# Altium footprint library THU VIEN V1.PcbLib: 400 footprints (part 21 of 25)
Each footprint in its own frame and in the unit in brackets; x right, y up, seen from the top. Pads: shape width x height; smd on the part's side, far side on the other; paste and mask are expansions set on the pad; w line width, h text height; cw(c..) or ccw(c..) is an arc to the next point about the centre after c.
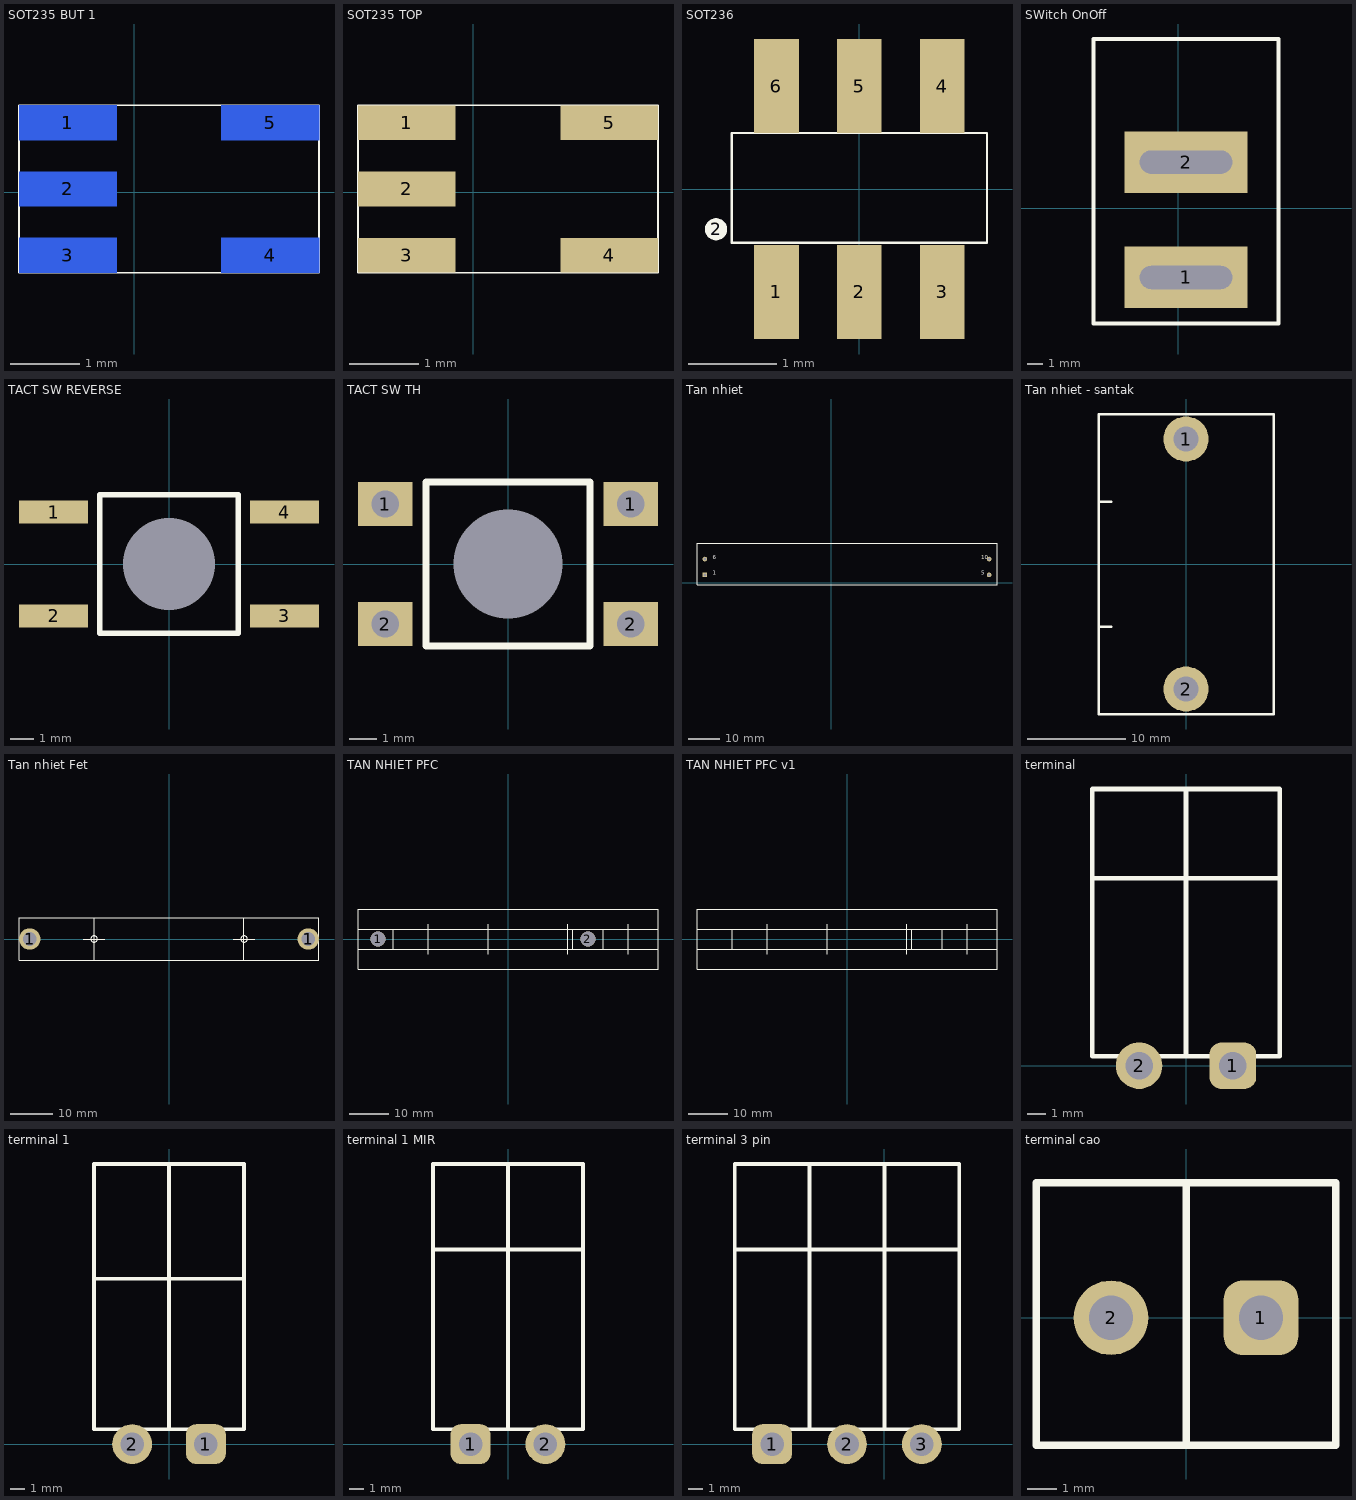
[diagram p20: the footprints below, top view; thin cyan lines are the x and y axes]

## SOT235 BUT 1 [mm]
pads (5):
  rect 1.4x0.5 smd far side: 1(-0.95,1) 2(-0.95,0.05) 3(-0.95,-0.9) 4(1.95,-0.9) 5(1.95,1)
Top Overlay:
  lines w0.025: -1.65,-1.15 -1.65,1.25 2.65,1.25 2.65,-1.15 -1.65,-1.15
3D body: height -0.38, standoff -1.68, extent -1,-1.45 2,1.55

## SOT235 TOP [mm]
pads (5):
  rect 1.4x0.5 smd: 1(-0.95,1) 2(-0.95,0.05) 3(-0.95,-0.9) 4(1.95,-0.9) 5(1.95,1)
Top Overlay:
  lines w0.025: -1.65,-1.15 2.65,-1.15 2.65,1.25 -1.65,1.25 -1.65,-1.15
3D body: height 1.3, standoff 0, extent -1,-1.45 2,1.55

## SOT236 [mil]
pads (7):
  rect 20x42 smd: 1(-37,-46) 2(0,-46) 3(37,-46) 4(37,46) 5(0,46) 6(-37,46)
  round 10 on Top Overlay: 2(-64,-18)
Top Overlay:
  lines w1: -57,-24 -57,25 57,25 57,-24 -57,-24
3D body: height 39.37, standoff 0, extent -57.48,-46.06 57.48,46.07

## SWitch OnOff [mm] "Cong tac dong ngat"
pads (2):
  rect 8x4 hole 1.5 slot 6 at 0 deg: 1(0.5,-4.5) 2(0.5,3)
Top Overlay:
  lines w0.254: -5.5,-7.5 -5.5,11 6.5,11 6.5,-7.5 -5.5,-7.5

## TACT SW REVERSE [mm]
pads (5):
  rect 3x1 smd: 1(-5,2.25) 2(-5,-2.25) 3(5,-2.25) 4(5,2.25)
  round 0 hole 4: ""(0,0)
Top Overlay:
  lines w0.254: -3,-3 3,-3 3,3 -3,3 -3,-3

## TACT SW TH [mm]
pads (5):
  rect 2x1.6 hole 1: 1(-4.5,2.2) 1(4.5,2.2) 2(-4.5,-2.2) 2(4.5,-2.2)
  round 0 hole 4: ""(0,0)
Top Overlay:
  lines w0.254: -3,-3 -3,3 3,3 3,-3 -3,-3

## Tan nhiet [mm] "Connector; Header; 5x2 Position"
pads (4):
  rect 1.5x1.5 hole 0.9: 1(-40.64,2.54)
  round 1.5 hole 0.9: 5(50.8,2.54) 6(-40.64,7.62) 10(50.8,7.62)
Top Overlay:
  lines w0.2: -43.18,-0.635 -43.18,12.7 53.34,12.7 53.34,-0.635 -43.18,-0.635
  text "6" at -38.1,7.62 h1.27
  text "10" at 48.26,7.62 h1.27
  text "5" at 48.26,2.54 h1.27
  text "1" at -38.1,2.54 h1.27
3D body: height 103.52, standoff 0.52, extent -44.92,-0.979 55.08,33.02

## Tan nhiet - santak [mil]
pads (2):
  round 180 hole 100: 1(0,500) 2(0,-500)
Top Overlay:
  lines w10: -350,-250 -300,-250 ; -350,250 -300,250 ; -350,-600 350,-600 350,600 -350,600 -350,-600
Mechanical 1:
  circle w5: c0,500 r45
3D body: height 300, standoff -200, extent -50,-549.9 49.61,-450.1
3D body: height 300, standoff -200, extent -50,450.1 49.61,549.9
3D body: height 1400, standoff 10, extent -350,-600 350,602

## Tan nhiet Fet [mil]
pads (2):
  round 200 hole 130: 1(-1300,0) 1(1300,0)
Top Overlay:
  circle w10: c700,0 r30
  circle w10: c-700,0 r30
  lines w10: -800,0 -600,0 ; -700,-200 -700,200 ; 600,0 800,0 ; 700,-200 700,200 ; -1400,-200 -1400,200 1400,200 1400,-200 -1400,-200
3D body: height 300, standoff -200, extent 1200,-99.8 1399.21,99.8
3D body: height 899.8, standoff 700.2, extent 600.79,-200 800,200
3D body: height 899.8, standoff 700.2, extent -800,-200 -600.79,200
3D body: height 300, standoff -200, extent -1400,-99.8 -1200.79,99.8
3D body: height 899.8, standoff 700.2, extent -800,-200 -600.79,200
3D body: height 2300, standoff 5, extent -1400,-200 1400,200

## TAN NHIET PFC [mm]
pads (2):
  round 3.81 hole 3.81: 1(-33.02,0) 2(20.32,0)
Top Overlay:
  lines w0.127: -29.21,-2.54 -29.21,2.54 ; 16.51,-2.54 16.51,2.54 ; 24.13,-2.54 24.13,2.54
  lines w0.254: -38.1,-2.54 38.1,-2.54 ; -38.1,2.54 38.1,2.54 ; -20.32,-3.81 -20.32,3.81 ; -5.08,-3.81 -5.08,3.81 ; 15.24,-3.81 15.24,3.81 ; 30.48,-3.81 30.48,3.81 ; -38.1,-7.62 38.1,-7.62 38.1,7.62 -38.1,7.62 -38.1,-7.62
3D body: height 5.08, standoff 0, extent -38.1,-2.54 -29.21,2.54
3D body: height 5.08, standoff 0, extent 16.51,-2.54 24.13,2.54
3D body: height 33.02, standoff 5.08, extent -38.1,-2.54 38.1,2.54
3D body: height 38.1, standoff 33.02, extent -38.1,-7.62 -22.86,7.62
3D body: height 38.1, standoff 33.02, extent -17.78,-7.62 -2.54,7.62
3D body: height 38.1, standoff 33.02, extent 2.54,-7.62 17.78,7.62
3D body: height 38.1, standoff 33.02, extent 22.86,-7.62 38.1,7.62
3D body: height 53.34, standoff 38.1, extent -38.1,6.35 -22.86,7.62
3D body: height 53.34, standoff 38.1, extent -38.1,4.064 -22.86,5.334
3D body: height 53.34, standoff 38.1, extent -38.1,1.651 -22.86,2.921
3D body: height 53.34, standoff 38.1, extent -38.1,-0.635 -22.86,0.635
3D body: height 53.34, standoff 38.1, extent -38.1,-2.921 -22.86,-1.651
3D body: height 53.34, standoff 38.1, extent -38.1,-5.461 -22.86,-4.191
3D body: height 53.34, standoff 38.1, extent -38.1,-7.62 -22.86,-6.35
3D body: height 53.34, standoff 38.1, extent -17.78,6.35 -2.54,7.62
3D body: height 53.34, standoff 38.1, extent -17.78,4.064 -2.54,5.334
3D body: height 53.34, standoff 38.1, extent -17.78,1.651 -2.54,2.921
3D body: height 53.34, standoff 38.1, extent -17.78,-0.635 -2.54,0.635
3D body: height 53.34, standoff 38.1, extent -17.78,-2.921 -2.54,-1.651
3D body: height 53.34, standoff 38.1, extent -17.78,-5.461 -2.54,-4.191
3D body: height 53.34, standoff 38.1, extent -17.78,-7.62 -2.54,-6.35
3D body: height 53.34, standoff 38.1, extent 2.54,6.35 17.78,7.62
3D body: height 53.34, standoff 38.1, extent 2.54,4.064 17.78,5.334
3D body: height 53.34, standoff 38.1, extent 2.54,1.651 17.78,2.921
3D body: height 53.34, standoff 38.1, extent 2.54,-0.635 17.78,0.635
3D body: height 53.34, standoff 38.1, extent 2.54,-2.921 17.78,-1.651
3D body: height 53.34, standoff 38.1, extent 2.54,-5.461 17.78,-4.191
3D body: height 53.34, standoff 38.1, extent 2.54,-7.62 17.78,-6.35
3D body: height 53.34, standoff 38.1, extent 22.86,6.35 38.1,7.62
3D body: height 53.34, standoff 38.1, extent 22.86,4.064 38.1,5.334
3D body: height 53.34, standoff 38.1, extent 22.86,1.651 38.1,2.921
3D body: height 53.34, standoff 38.1, extent 22.86,-0.635 38.1,0.635
3D body: height 53.34, standoff 38.1, extent 22.86,-2.921 38.1,-1.651
3D body: height 53.34, standoff 38.1, extent 22.86,-5.461 38.1,-4.191
3D body: height 53.34, standoff 38.1, extent 22.86,-7.62 38.1,-6.35

## TAN NHIET PFC v1 [mm]
Top Overlay:
  lines w0.127: -29.21,-2.54 -29.21,2.54 ; 16.51,-2.54 16.51,2.54 ; 24.13,-2.54 24.13,2.54
  lines w0.254: -38.1,-2.54 38.1,-2.54 ; -38.1,2.54 38.1,2.54 ; -20.32,-3.81 -20.32,3.81 ; -5.08,-3.81 -5.08,3.81 ; 15.24,-3.81 15.24,3.81 ; 30.48,-3.81 30.48,3.81 ; -38.1,-7.62 38.1,-7.62 38.1,7.62 -38.1,7.62 -38.1,-7.62
3D body: height 5.08, standoff 0, extent -38.1,-2.54 -29.21,2.54
3D body: height 5.08, standoff 0, extent 16.51,-2.54 24.13,2.54
3D body: height 33.02, standoff 5.08, extent -38.1,-2.54 38.1,2.54
3D body: height 38.1, standoff 33.02, extent -38.1,-7.62 -22.86,7.62
3D body: height 38.1, standoff 33.02, extent -17.78,-7.62 -2.54,7.62
3D body: height 38.1, standoff 33.02, extent 2.54,-7.62 17.78,7.62
3D body: height 38.1, standoff 33.02, extent 22.86,-7.62 38.1,7.62
3D body: height 53.34, standoff 38.1, extent -38.1,6.35 -22.86,7.62
3D body: height 53.34, standoff 38.1, extent -38.1,4.064 -22.86,5.334
3D body: height 53.34, standoff 38.1, extent -38.1,1.651 -22.86,2.921
3D body: height 53.34, standoff 38.1, extent -38.1,-0.635 -22.86,0.635
3D body: height 53.34, standoff 38.1, extent -38.1,-2.921 -22.86,-1.651
3D body: height 53.34, standoff 38.1, extent -38.1,-5.461 -22.86,-4.191
3D body: height 53.34, standoff 38.1, extent -38.1,-7.62 -22.86,-6.35
3D body: height 53.34, standoff 38.1, extent -17.78,6.35 -2.54,7.62
3D body: height 53.34, standoff 38.1, extent -17.78,4.064 -2.54,5.334
3D body: height 53.34, standoff 38.1, extent -17.78,1.651 -2.54,2.921
3D body: height 53.34, standoff 38.1, extent -17.78,-0.635 -2.54,0.635
3D body: height 53.34, standoff 38.1, extent -17.78,-2.921 -2.54,-1.651
3D body: height 53.34, standoff 38.1, extent -17.78,-5.461 -2.54,-4.191
3D body: height 53.34, standoff 38.1, extent -17.78,-7.62 -2.54,-6.35
3D body: height 53.34, standoff 38.1, extent 2.54,6.35 17.78,7.62
3D body: height 53.34, standoff 38.1, extent 2.54,4.064 17.78,5.334
3D body: height 53.34, standoff 38.1, extent 2.54,1.651 17.78,2.921
3D body: height 53.34, standoff 38.1, extent 2.54,-0.635 17.78,0.635
3D body: height 53.34, standoff 38.1, extent 2.54,-2.921 17.78,-1.651
3D body: height 53.34, standoff 38.1, extent 2.54,-5.461 17.78,-4.191
3D body: height 53.34, standoff 38.1, extent 2.54,-7.62 17.78,-6.35
3D body: height 53.34, standoff 38.1, extent 22.86,6.35 38.1,7.62
3D body: height 53.34, standoff 38.1, extent 22.86,4.064 38.1,5.334
3D body: height 53.34, standoff 38.1, extent 22.86,1.651 38.1,2.921
3D body: height 53.34, standoff 38.1, extent 22.86,-0.635 38.1,0.635
3D body: height 53.34, standoff 38.1, extent 22.86,-2.921 38.1,-1.651
3D body: height 53.34, standoff 38.1, extent 22.86,-5.461 38.1,-4.191
3D body: height 53.34, standoff 38.1, extent 22.86,-7.62 38.1,-6.35

## terminal [mm]
pads (2):
  rrect50% 2.524x2.524 hole 1.5: 1(2.54,0)
  round 2.524 hole 1.5: 2(-2.54,0)
Top Overlay:
  lines w0.254: -5.08,10.16 5.08,10.16 ; 0,0.508 0,14.986 ; -5.08,0.508 -5.08,13.97 -5.08,14.986 5.08,14.986 5.08,0.508 -5.08,0.508
3D body: height 3, standoff -9.5, extent -5.55,-0.388 5,14.008

## terminal 1 [mm]
pads (2):
  rrect50% 2.7x2.7 hole 1.6: 1(2.5,0)
  round 2.7 hole 1.6: 2(-2.5,0)
Top Overlay:
  lines w0.254: -5.08,11.208 5.08,11.208 ; 0,1 0,19 ; -5.08,1 -5.08,13.97 -5.08,19 5.08,19 5.08,1 -5.08,1
3D body: height 3.5, standoff -11, extent -5.602,-0.489 5.631,19.512

## terminal 1 MIR [mm]
pads (2):
  rrect50% 2.7x2.7 hole 1.6: 1(-2.54,0)
  round 2.7 hole 1.6: 2(2.54,0)
Top Overlay:
  lines w0.254: -5.08,13.208 5.08,13.208 ; 0,1 0,19 ; -5.08,1 -5.08,13.97 -5.08,19 5.08,19 5.08,1 -5.08,1
3D body: height 3.5, standoff -11, extent -5.602,-0.489 5.631,19.512

## terminal 3 pin [mm]
pads (3):
  rrect50% 2.7x2.7 hole 1.6: 1(-7.62,0)
  round 2.7 hole 1.6: 2(-2.54,0) 3(2.54,0)
Top Overlay:
  lines w0.254: -10.16,1 -10.16,19 -5.08,19 ; -10.16,13.208 -5.08,13.208 5.08,13.208 ; -10.08,1 -5,1 ; 0,1 0,19 ; -5.08,19 -5.08,13.97 -5.08,1 5.08,1 5.08,19 -5.08,19
3D body: height 3.5, standoff -11, extent -10.682,-0.489 0.551,19.512
3D body: height 3.5, standoff -11, extent -5.602,-0.489 5.631,19.512

## terminal cao [mm]
pads (2):
  rrect50% 2.524x2.524 hole 1.5: 1(2.54,0)
  round 2.524 hole 1.5: 2(-2.54,0)
Top Overlay:
  lines w0.254: 0,-4.318 0,4.572 ; -5.08,-4.318 5.08,-4.318 5.08,4.572 -5.08,4.572 -5.08,-4.318
3D body: height 3, standoff -14, extent -5.021,-4.428 5.529,4.572